# Altium footprint library 7-Connectors-8.PcbLib: 18 footprints (part 1 of 2) (continued)
## FCI_10058937-100ABTLF [mm] "26 Contacts, Pitch 1mm, Surface Mount ExpressCard Host Connector"
height 5.5
pads (28):
  rect 0.7x2 smd: 1(-12.5,0) 2(-11.5,0) 3(-10.5,0) 4(-9.5,0) 5(-8.5,0) 6(-7.5,0) 7(-6.5,0) 8(-5.5,0) 9(-4.5,0) 10(-3.5,0) 11(-2.5,0) 12(-1.5,0) 13(-0.5,0) 14(0.5,0) 15(1.5,0) 16(2.5,0) 17(3.5,0) 18(4.5,0) 19(5.5,0) 20(6.5,0) 21(7.5,0) 22(8.5,0) 23(9.5,0) 24(10.5,0) 25(11.5,0) 26(12.5,0)
  round 1 hole 2 unplated mask+0.5: Mec1(-17.1,-3.5)
  round 1 hole 1.6 unplated mask+0.3: Mec2(17.1,-3.5)
Top Layer:
  region: -19.2,-0.8 -13.2,-0.8 -13.2,-1.3 13.2,-1.3 13.2,-0.8 19.2,-0.8 19.2,-11.75 -19.2,-11.75
Top Overlay:
  drawing of 182 lines, arcs and shapes, not listed
Mechanical 8:
  drawing of 174 lines, arcs and shapes, not listed
Mechanical 14:
  drawing of 181 lines, arcs and shapes, not listed
Mechanical 15:
  lines w0.05: -19.35,-14.9 19.35,-14.9 19.35,1.25 -19.35,1.25 -19.35,-14.9
3D body "FCI_10058937-100ABTLF.stp": height 5.5, standoff -0.9, extent -19.55,-14.65 19.1,0.604

## FCI_HM2R01PA5108N9LF [mm] "110+13 Contacts, 22 positions x 5 Rows (a,b,c,d,e) in Two Part + Shield  Row (f) 13 Positions, Pitch 2 mm,  Press-Fit, Right Angle Hard Metric Female Connector, Millipacs, Type A"
height 12.25
pads (125):
  round 1.1 hole 0.6: a1(5,24) a2(5,22) a3(5,20) a4(5,18) a5(5,16) a6(5,14) a7(5,12) a8(5,10) a9(5,8) a10(5,6) a11(5,4) a15(5,-4) a16(5,-6) a17(5,-8) a18(5,-10) a19(5,-12) a20(5,-14) a21(5,-16) a22(5,-18) a23(5,-20) a24(5,-22) a25(5,-24) b1(3,24) b2(3,22) b3(3,20) b4(3,18) b5(3,16) b6(3,14) b7(3,12) b8(3,10) b9(3,8) b10(3,6) b11(3,4) b15(3,-4) b16(3,-6) b17(3,-8) b18(3,-10) b19(3,-12) b20(3,-14) b21(3,-16) b22(3,-18) b23(3,-20) b24(3,-22) b25(3,-24) c1(1,24) c2(1,22) c3(1,20) c4(1,18) c5(1,16) c6(1,14) c7(1,12) c8(1,10) c9(1,8) c10(1,6) c11(1,4) c15(1,-4) c16(1,-6) c17(1,-8) c18(1,-10) c19(1,-12) c20(1,-14) c21(1,-16) c22(1,-18) c23(1,-20) c24(1,-22) c25(1,-24) d1(-1,24) d2(-1,22) d3(-1,20) d4(-1,18) d5(-1,16) d6(-1,14) d7(-1,12) d8(-1,10) d9(-1,8) d10(-1,6) d11(-1,4) d15(-1,-4) d16(-1,-6) d17(-1,-8) d18(-1,-10) d19(-1,-12) d20(-1,-14) d21(-1,-16) d22(-1,-18) d23(-1,-20) d24(-1,-22) d25(-1,-24) e1(-3,24) e2(-3,22) e3(-3,20) e4(-3,18) e5(-3,16) e6(-3,14) e7(-3,12) e8(-3,10) e9(-3,8) e10(-3,6) e11(-3,4) e15(-3,-4) e16(-3,-6) e17(-3,-8) e18(-3,-10) e19(-3,-12) e20(-3,-14) e21(-3,-16) e22(-3,-18) e23(-3,-20) e24(-3,-22) e25(-3,-24) f1(-5,24) f3(-5,20) f5(-5,16) f7(-5,12) f9(-5,8) f11(-5,4) f13(-5,0) f15(-5,-4) f17(-5,-8) f19(-5,-12) f21(-5,-16) f23(-5,-20) f25(-5,-24)
  round 1 hole 2 unplated mask+0.6: MECH1(-3,0) MECH2(3,0)
Top Overlay:
  lines w0.2: -5.15,-25 15.8,-25 15.8,-1.825 ; -5.15,-23 -5.15,-21 ; -5.15,-19 -5.15,-17 ; -5.15,-15 -5.15,-13 ; -5.15,-11 -5.15,-9 ; -5.15,-7 -5.15,-5 ; -5.15,-3 -5.15,-1 ; -5.15,1 -5.15,3 ; -5.15,5 -5.15,7 ; -5.15,9 -5.15,11 ; -5.15,13 -5.15,15 ; -5.15,17 -5.15,19 ; -5.15,21 -5.15,23 ; -5.15,25 15.8,25 15.8,1.825 ; 8,-2.464 15.8,-2.464 ; 8,-1.824 17.4,-1.825 18.65,-0.575 18.65,0.575 17.4,1.825 8,1.825 ; 8,2.464 15.8,2.464 ; 15.1,-25 15.1,-3.05 ; 15.1,-23.45 9.65,-23.45 9.65,-22.55 15.1,-22.55 ; 15.1,-21.45 9.65,-21.45 9.65,-20.55 15.1,-20.55 ; 15.1,-19.45 9.65,-19.45 9.65,-18.55 15.1,-18.55 ; 15.1,-17.45 9.65,-17.45 9.65,-16.55 15.1,-16.55 ; 15.1,-15.45 9.65,-15.45 9.65,-14.55 15.1,-14.55 ; 15.1,-13.45 9.65,-13.45 9.65,-12.55 15.1,-12.55 ; 15.1,-11.45 9.65,-11.45 9.65,-10.55 15.1,-10.55 ; 15.1,-9.45 9.65,-9.45 9.65,-8.55 15.1,-8.55 ; 15.1,-7.45 9.65,-7.45 9.65,-6.55 15.1,-6.55 ; 15.1,-5.45 9.65,-5.45 9.65,-4.55 15.1,-4.55 ; 15.1,3.05 15.1,25 ; 15.1,4.55 9.65,4.55 9.65,5.45 15.1,5.45 ; 15.1,6.55 9.65,6.55 9.65,7.45 15.1,7.45 ; 15.1,8.55 9.65,8.55 9.65,9.45 15.1,9.45 ; 15.1,10.55 9.65,10.55 9.65,11.45 15.1,11.45 ; 15.1,12.55 9.65,12.55 9.65,13.45 15.1,13.45 ; 15.1,14.55 9.65,14.55 9.65,15.45 15.1,15.45 ; 15.1,16.55 9.65,16.55 9.65,17.45 15.1,17.45 ; 15.1,18.55 9.65,18.55 9.65,19.45 15.1,19.45 ; 15.1,20.55 9.65,20.55 9.65,21.45 15.1,21.45 ; 15.1,22.55 9.65,22.55 9.65,23.45 15.1,23.45 ; 15.8,-3.05 8,-3.05 8,3.05 15.8,3.05 ; 17.325,-1.825 17.325,1.825 ; 17.75,-1.5 19,-0.25 19,0.25 17.75,1.5
  text "a" at 4.667,25.492 h1.5
  text "e" at -3.333,25.542 h1.5
  text "d" at -1.333,25.5 h1.5
  text "c" at 0.692,25.492 h1.5
  text "b" at 2.667,25.5 h1.5
  text "f" at -5.363,25.5 h1.5
  text "1" at -5.975,23.8 h1.2
  text "11" at -5.975,3.217 h1.2
  text "20" at -5.975,-14.783 h1.2
  text "25" at -5.975,-24.783 h1.2
Mechanical 8:
  drawing of 506 lines, arcs and shapes, not listed
Mechanical 14:
  lines w0.1: 8,-2.464 15.8,-2.464 ; 8,-1.824 17.4,-1.825 18.65,-0.575 18.65,0.575 17.4,1.825 8,1.825 ; 8,2.464 15.8,2.464 ; 15.1,-25 15.1,-3.05 ; 15.1,-23.45 9.65,-23.45 9.65,-22.55 15.1,-22.55 ; 15.1,-21.45 9.65,-21.45 9.65,-20.55 15.1,-20.55 ; 15.1,-19.45 9.65,-19.45 9.65,-18.55 15.1,-18.55 ; 15.1,-17.45 9.65,-17.45 9.65,-16.55 15.1,-16.55 ; 15.1,-15.45 9.65,-15.45 9.65,-14.55 15.1,-14.55 ; 15.1,-13.45 9.65,-13.45 9.65,-12.55 15.1,-12.55 ; 15.1,-11.45 9.65,-11.45 9.65,-10.55 15.1,-10.55 ; 15.1,-9.45 9.65,-9.45 9.65,-8.55 15.1,-8.55 ; 15.1,-7.45 9.65,-7.45 9.65,-6.55 15.1,-6.55 ; 15.1,-5.45 9.65,-5.45 9.65,-4.55 15.1,-4.55 ; 15.1,3.05 15.1,25 ; 15.1,4.55 9.65,4.55 9.65,5.45 15.1,5.45 ; 15.1,6.55 9.65,6.55 9.65,7.45 15.1,7.45 ; 15.1,8.55 9.65,8.55 9.65,9.45 15.1,9.45 ; 15.1,10.55 9.65,10.55 9.65,11.45 15.1,11.45 ; 15.1,12.55 9.65,12.55 9.65,13.45 15.1,13.45 ; 15.1,14.55 9.65,14.55 9.65,15.45 15.1,15.45 ; 15.1,16.55 9.65,16.55 9.65,17.45 15.1,17.45 ; 15.1,18.55 9.65,18.55 9.65,19.45 15.1,19.45 ; 15.1,20.55 9.65,20.55 9.65,21.45 15.1,21.45 ; 15.1,22.55 9.65,22.55 9.65,23.45 15.1,23.45 ; 15.8,-3.05 8,-3.05 8,3.05 15.8,3.05 ; 15.8,-1.825 15.8,-25 -5.15,-25 -5.15,25 15.8,25 15.8,1.825 ; 17.325,-1.825 17.325,1.825 ; 17.75,-1.5 19,-0.25 19,0.25 17.75,1.5
  text "a" at 4.667,25.492 h1.5
  text "b" at 2.667,25.5 h1.5
  text "c" at 0.692,25.492 h1.5
  text "d" at -1.333,25.5 h1.5
  text "e" at -3.333,25.542 h1.5
  text "f" at -5.363,25.5 h1.5
  text "25" at -5.975,-24.783 h1.2
  text "20" at -5.975,-14.783 h1.2
  text "11" at -5.975,3.217 h1.2
  text "1" at -5.975,23.8 h1.2
Drill Drawing:
  lines w0.1: -6.25,-18.7 -6.25,-25 6.15,-25 6.15,-2.475 -5.15,-2.475 -5.15,2.475 6.15,2.475 6.15,25 -6.25,25 -6.25,19.6
  text "PRESS-FIT TECHNOLOGY diam. 0.6mm +0.05 -0" at -6.1,-17.85 h1
3D body "FCI_HM2R01PA5108N9LF.stp": height 8.13, standoff -4.13, extent -5.15,-25 19,25

## FCI_HM2R70PA5108N9LF [mm] "110+11 Contacts, 22 positions x 5 Rows  (a,b,c,d,e) +  Shield  Row (f) 11 Positions, Pitch 2 mm,  Press-Fit, Right Angle Hard Metric Female Connector, Millipacs, Type B22"
height 11.4
pads (121):
  round 1.1 hole 0.6: a1(4,21) a2(4,19) a3(4,17) a4(4,15) a5(4,13) a6(4,11) a7(4,9) a8(4,7) a9(4,5) a10(4,3) a11(4,1) a12(4,-1) a13(4,-3) a14(4,-5) a15(4,-7) a16(4,-9) a17(4,-11) a18(4,-13) a19(4,-15) a20(4,-17) a21(4,-19) a22(4,-21) b1(2,21) b2(2,19) b3(2,17) b4(2,15) b5(2,13) b6(2,11) b7(2,9) b8(2,7) b9(2,5) b10(2,3) b11(2,1) b12(2,-1) b13(2,-3) b14(2,-5) b15(2,-7) b16(2,-9) b17(2,-11) b18(2,-13) b19(2,-15) b20(2,-17) b21(2,-19) b22(2,-21) c1(0,21) c2(0,19) c3(0,17) c4(0,15) c5(0,13) c6(0,11) c7(0,9) c8(0,7) c9(0,5) c10(0,3) c11(0,1) c12(0,-1) c13(0,-3) c14(0,-5) c15(0,-7) c16(0,-9) c17(0,-11) c18(0,-13) c19(0,-15) c20(0,-17) c21(0,-19) c22(0,-21) d1(-2,21) d2(-2,19) d3(-2,17) d4(-2,15) d5(-2,13) d6(-2,11) d7(-2,9) d8(-2,7) d9(-2,5) d10(-2,3) d11(-2,1) d12(-2,-1) d13(-2,-3) d14(-2,-5) d15(-2,-7) d16(-2,-9) d17(-2,-11) d18(-2,-13) d19(-2,-15) d20(-2,-17) d21(-2,-19) d22(-2,-21) e1(-4,21) e2(-4,19) e3(-4,17) e4(-4,15) e5(-4,13) e6(-4,11) e7(-4,9) e8(-4,7) e9(-4,5) e10(-4,3) e11(-4,1) e12(-4,-1) e13(-4,-3) e14(-4,-5) e15(-4,-7) e16(-4,-9) e17(-4,-11) e18(-4,-13) e19(-4,-15) e20(-4,-17) e21(-4,-19) e22(-4,-21) f1(-6,21) f3(-6,17) f5(-6,13) f7(-6,9) f9(-6,5) f11(-6,1) f13(-6,-3) f15(-6,-7) f17(-6,-11) f19(-6,-15) f21(-6,-19)
Top Overlay:
  lines w0.2: -6.15,-20 -6.15,-22 14.8,-22 14.8,22 -6.15,22 ; -6.15,-18.002 -6.15,-16.002 ; -6.15,-14.002 -6.15,-12.002 ; -6.15,-10.002 -6.15,-8.002 ; -6.15,-6.002 -6.15,-4.002 ; -6.15,-2.002 -6.15,-0.002 ; -6.15,1.998 -6.15,3.998 ; -6.15,5.998 -6.15,7.998 ; -6.15,9.998 -6.15,11.998 ; -6.15,13.998 -6.15,15.998 ; -6.15,17.998 -6.15,19.998 ; 7,-22 7,22 ; 14.1,-22 14.1,22 ; 14.1,-20.45 8.65,-20.45 8.65,-19.55 14.1,-19.55 ; 14.1,-18.45 8.65,-18.45 8.65,-17.55 14.1,-17.55 ; 14.1,-16.45 8.65,-16.45 8.65,-15.55 14.1,-15.55 ; 14.1,-14.45 8.65,-14.45 8.65,-13.55 14.1,-13.55 ; 14.1,-12.45 8.65,-12.45 8.65,-11.55 14.1,-11.55 ; 14.1,-10.45 8.65,-10.45 8.65,-9.55 14.1,-9.55 ; 14.1,-8.45 8.65,-8.45 8.65,-7.55 14.1,-7.55 ; 14.1,-6.45 8.65,-6.45 8.65,-5.55 14.1,-5.55 ; 14.1,-4.45 8.65,-4.45 8.65,-3.55 14.1,-3.55 ; 14.1,-2.45 8.65,-2.45 8.65,-1.55 14.1,-1.55 ; 14.1,-0.45 8.65,-0.45 8.65,0.45 14.1,0.45 ; 14.1,1.55 8.65,1.55 8.65,2.45 14.1,2.45 ; 14.1,3.55 8.65,3.55 8.65,4.45 14.1,4.45 ; 14.1,5.55 8.65,5.55 8.65,6.45 14.1,6.45 ; 14.1,7.55 8.65,7.55 8.65,8.45 14.1,8.45 ; 14.1,9.55 8.65,9.55 8.65,10.45 14.1,10.45 ; 14.1,11.55 8.65,11.55 8.65,12.45 14.1,12.45 ; 14.1,13.55 8.65,13.55 8.65,14.45 14.1,14.45 ; 14.1,15.55 8.65,15.55 8.65,16.45 14.1,16.45 ; 14.1,17.55 8.65,17.55 8.65,18.45 14.1,18.45 ; 14.1,19.55 8.65,19.55 8.65,20.45 14.1,20.45
  text "11" at -6.975,0.217 h1.2
  text "1" at -6.975,20.8 h1.2
  text "f" at -6.363,22.5 h1.5
  text "b" at 1.667,22.5 h1.5
  text "c" at -0.333,22.667 h1.5
  text "d" at -2.333,22.5 h1.5
  text "e" at -4.333,22.667 h1.5
  text "a" at 3.592,22.517 h1.5
  text "22" at -6.975,-21.786 h1.2
  text "15" at -6.975,-7.783 h1.2
Mechanical 8:
  drawing of 490 lines, arcs and shapes, not listed
Mechanical 14:
  lines w0.1: -6.15,-22 14.8,-22 14.8,22 -6.15,22 ; 7,-22 7,22 ; 14.1,-22 14.1,22 ; 14.1,-20.45 8.65,-20.45 8.65,-19.55 14.1,-19.55 ; 14.1,-18.45 8.65,-18.45 8.65,-17.55 14.1,-17.55 ; 14.1,-16.45 8.65,-16.45 8.65,-15.55 14.1,-15.55 ; 14.1,-14.45 8.65,-14.45 8.65,-13.55 14.1,-13.55 ; 14.1,-12.45 8.65,-12.45 8.65,-11.55 14.1,-11.55 ; 14.1,-10.45 8.65,-10.45 8.65,-9.55 14.1,-9.55 ; 14.1,-8.45 8.65,-8.45 8.65,-7.55 14.1,-7.55 ; 14.1,-6.45 8.65,-6.45 8.65,-5.55 14.1,-5.55 ; 14.1,-4.45 8.65,-4.45 8.65,-3.55 14.1,-3.55 ; 14.1,-2.45 8.65,-2.45 8.65,-1.55 14.1,-1.55 ; 14.1,-0.45 8.65,-0.45 8.65,0.45 14.1,0.45 ; 14.1,1.55 8.65,1.55 8.65,2.45 14.1,2.45 ; 14.1,3.55 8.65,3.55 8.65,4.45 14.1,4.45 ; 14.1,5.55 8.65,5.55 8.65,6.45 14.1,6.45 ; 14.1,7.55 8.65,7.55 8.65,8.45 14.1,8.45 ; 14.1,9.55 8.65,9.55 8.65,10.45 14.1,10.45 ; 14.1,11.55 8.65,11.55 8.65,12.45 14.1,12.45 ; 14.1,13.55 8.65,13.55 8.65,14.45 14.1,14.45 ; 14.1,15.55 8.65,15.55 8.65,16.45 14.1,16.45 ; 14.1,17.55 8.65,17.55 8.65,18.45 14.1,18.45 ; 14.1,19.55 8.65,19.55 8.65,20.45 14.1,20.45
  text "1" at -6.975,20.8 h1.2
  text "11" at -6.975,0.217 h1.2
  text "f" at -6.363,22.5 h1.5
  text "e" at -4.333,22.667 h1.5
  text "d" at -2.333,22.5 h1.5
  text "c" at -0.333,22.667 h1.5
  text "b" at 1.667,22.5 h1.5
  text "a" at 3.592,22.517 h1.5
  text "22" at -6.975,-21.786 h1.2
  text "15" at -6.975,-7.783 h1.2
Drill Drawing:
  lines w0.1: -6.975,-19.3 -6.975,-22 5.225,-22 5.225,22 -6.975,22 -6.975,19.075
  text "PRESS-FIT TECHNOLOGY diam. 0.6mm +0.05 -0" at -7.25,-18.175 h1
3D body "FCI_HM2R70PA5108N9LF.stp": height 7.7, standoff -3.7, extent -6.15,-22 14.8,22

## HARTING_17 26 220 2102 [mm] "HAR-BUS HM, 220 Contacts (abcdef) Female Connector, Type Monoblock 47, with Shield  Row(f)"
height 12.35
pads (244):
  round 1.1 hole 0.6: a1(0,0) a2(0,-2) a3(0,-4) a4(0,-6) a5(0,-8) a6(0,-10) a7(0,-12) a8(0,-14) a9(0,-16) a10(0,-18) a11(0,-20) a12(0,-22) a13(0,-24) a14(0,-26) a15(0,-28) a16(0,-30) a17(0,-32) a18(0,-34) a19(0,-36) a20(0,-38) a21(0,-40) a22(0,-42) a23(0,-44) a24(0,-46) a25(0,-48) a26(0,-50) a27(0,-52) a28(0,-54) a29(0,-56) a30(0,-58) a31(0,-60) a32(0,-62) a33(0,-64) a37(0,-72) a38(0,-74) a39(0,-76) a40(0,-78) a41(0,-80) a42(0,-82) a43(0,-84) a44(0,-86) a45(0,-88) a46(0,-90) a47(0,-92) b1(-2,0) b2(-2,-2) b3(-2,-4) b4(-2,-6) b5(-2,-8) b6(-2,-10) b7(-2,-12) b8(-2,-14) b9(-2,-16) b10(-2,-18) b11(-2,-20) b12(-2,-22) b13(-2,-24) b14(-2,-26) b15(-2,-28) b16(-2,-30) b17(-2,-32) b18(-2,-34) b19(-2,-36) b20(-2,-38) b21(-2,-40) b22(-2,-42) b23(-2,-44) b24(-2,-46) b25(-2,-48) b26(-2,-50) b27(-2,-52) b28(-2,-54) b29(-2,-56) b30(-2,-58) b31(-2,-60) b32(-2,-62) b33(-2,-64) b37(-2,-72) b38(-2,-74) b39(-2,-76) b40(-2,-78) b41(-2,-80) b42(-2,-82) b43(-2,-84) b44(-2,-86) b45(-2,-88) b46(-2,-90) b47(-2,-92) c1(-4,0) c2(-4,-2) c3(-4,-4) c4(-4,-6) c5(-4,-8) c6(-4,-10) c7(-4,-12) c8(-4,-14) c9(-4,-16) c10(-4,-18) c11(-4,-20) c12(-4,-22) c13(-4,-24) c14(-4,-26) c15(-4,-28) c16(-4,-30) c17(-4,-32) c18(-4,-34) c19(-4,-36) c20(-4,-38) c21(-4,-40) c22(-4,-42) c23(-4,-44) c24(-4,-46) c25(-4,-48) c26(-4,-50) c27(-4,-52) c28(-4,-54) c29(-4,-56) c30(-4,-58) c31(-4,-60) c32(-4,-62) c33(-4,-64) c37(-4,-72) c38(-4,-74) c39(-4,-76) c40(-4,-78) c41(-4,-80) c42(-4,-82) c43(-4,-84) c44(-4,-86) c45(-4,-88) c46(-4,-90) c47(-4,-92) d1(-6,0) d2(-6,-2) d3(-6,-4) d4(-6,-6) d5(-6,-8) d6(-6,-10) d7(-6,-12) d8(-6,-14) d9(-6,-16) d10(-6,-18) d11(-6,-20) d12(-6,-22) d13(-6,-24) d14(-6,-26) d15(-6,-28) d16(-6,-30) d17(-6,-32) d18(-6,-34) d19(-6,-36) d20(-6,-38) d21(-6,-40) d22(-6,-42) d23(-6,-44) d24(-6,-46) d25(-6,-48) d26(-6,-50) d27(-6,-52) d28(-6,-54) d29(-6,-56) d30(-6,-58) d31(-6,-60) d32(-6,-62) d33(-6,-64) d37(-6,-72) d38(-6,-74) d39(-6,-76) d40(-6,-78) d41(-6,-80) d42(-6,-82) d43(-6,-84) d44(-6,-86) d45(-6,-88) d46(-6,-90) d47(-6,-92) e1(-8,0) e2(-8,-2) e3(-8,-4) e4(-8,-6) e5(-8,-8) e6(-8,-10) e7(-8,-12) e8(-8,-14) e9(-8,-16) e10(-8,-18) e11(-8,-20) e12(-8,-22) e13(-8,-24) e14(-8,-26) e15(-8,-28) e16(-8,-30) e17(-8,-32) e18(-8,-34) e19(-8,-36) e20(-8,-38) e21(-8,-40) e22(-8,-42) e23(-8,-44) e24(-8,-46) e25(-8,-48) e26(-8,-50) e27(-8,-52) e28(-8,-54) e29(-8,-56) e30(-8,-58) e31(-8,-60) e32(-8,-62) e33(-8,-64) e37(-8,-72) e38(-8,-74) e39(-8,-76) e40(-8,-78) e41(-8,-80) e42(-8,-82) e43(-8,-84) e44(-8,-86) e45(-8,-88) e46(-8,-90) e47(-8,-92) f1(-10,0) f3(-10,-4) f5(-10,-8) f7(-10,-12) f9(-10,-16) f11(-10,-20) f13(-10,-24) f15(-10,-28) f17(-10,-32) f19(-10,-36) f21(-10,-40) f23(-10,-44) f25(-10,-48) f27(-10,-52) f29(-10,-56) f31(-10,-60) f33(-10,-64) f35(-10,-68) f37(-10,-72) f39(-10,-76) f41(-10,-80) f43(-10,-84) f45(-10,-88) f47(-10,-92)
Top Overlay:
  drawing of 311 lines, arcs and shapes, not listed
  text "20" at -10.7,-38.833 h1.2
  text "10" at -10.7,-18.833 h1.2
  text "47" at -10.7,-92.833 h1.2
  text "37" at -10.7,-72.833 h1.2
  text "33" at -10.7,-64.833 h1.2
  text "f" at -10.363,1.5 h1.5
  text "a" at -0.333,1.667 h1.5
  text "b" at -2.333,1.5 h1.5
  text "c" at -4.333,1.667 h1.5
  text "d" at -6.333,1.5 h1.5
  text "e" at -8.333,1.667 h1.5
  text "1" at -10.7,-0.25 h1.2
Mechanical 8:
  drawing of 491 lines, arcs and shapes, not listed
  text "PCB" at 1.3,-48 h1.5
Mechanical 14:
  drawing of 287 lines, arcs and shapes, not listed
  text "20" at -10.7,-38.833 h1.2
  text "10" at -10.7,-18.833 h1.2
  text "47" at -10.7,-92.833 h1.2
  text "37" at -10.7,-72.833 h1.2
  text "33" at -10.7,-64.833 h1.2
  text "1" at -10.7,-0.25 h1.2
  text "f" at -10.363,1.5 h1.5
  text "e" at -8.333,1.667 h1.5
  text "d" at -6.333,1.5 h1.5
  text "c" at -4.333,1.667 h1.5
  text "b" at -2.333,1.5 h1.5
  text "a" at -0.333,1.667 h1.5
Drill Drawing:
  lines w0.1: -11,-92.95 -11,1 ; 1,-92.95 1,1
  lines w0.2: -11,-92.95 1,-92.95 ; -11,1 1,1
  text "PRESS-FIT TECHNOLOGY diam. 0.6mm +0.05 -0" at 2.625,-67.398 h1
3D body "HARTING_17 26 220 2102.stp": height 8.15, standoff -4.1, extent -10.1,-92.95 13.65,0.95

## MTGP720H320V6P [mm]
pads (1):
  round 7.2 hole 3.25: 1(0,0)
via -2.2,-1.35 diameter 1 hole 0.5
via -2.2,1.375 diameter 1 hole 0.5
via 0,2.525 diameter 1 hole 0.5
via 2.2,1.35 diameter 1 hole 0.5
via 0,-2.625 diameter 1 hole 0.5
via 2.2,-1.35 diameter 1 hole 0.5
Mechanical 8:
  circle w0.1: c0,0 r2.6
  circle w0.1: c0,0 r3.75
  lines w0.1: -2.657,1.625 -2.224,1.375 ; -2.632,-1.6 -2.199,-1.35 ; -2.474,0.942 -2.224,1.375 ; -2.449,-0.917 -2.199,-1.35 ; -1.974,1.808 -2.224,1.375 ; -1.949,-1.783 -2.199,-1.35 ; -1.791,1.125 -2.224,1.375 ; -1.766,-1.1 -2.199,-1.35 ; -0.5,-2.625 0,-2.625 ; -0.5,0 0,0 ; -0.5,2.525 0,2.525 ; 0,-3.125 0,-2.625 ; 0,-2.125 0,-2.625 ; 0,-0.5 0,0 ; 0,0.5 0,0 ; 0,2.025 0,2.525 ; 0,3.025 0,2.525 ; 0.5,-2.625 0,-2.625 ; 0.5,0 0,0 ; 0.5,2.525 0,2.525 ; 1.766,-1.1 2.199,-1.35 ; 1.766,1.1 2.199,1.35 ; 1.949,-1.783 2.199,-1.35 ; 1.949,1.783 2.199,1.35 ; 2.449,-0.917 2.199,-1.35 ; 2.449,0.917 2.199,1.35 ; 2.632,-1.6 2.199,-1.35 ; 2.632,1.6 2.199,1.35
Mechanical 14:
  circle w0.1: c0,0 r3.75
Mechanical 15:
  circle w0.05: c0,0 r3.85
3D body "mtgp720h320v6p.stp": height 0.1, standoff -1.75, extent -3.627,-3.627 3.628,3.628

## PB [mm]
Top Overlay:
  circle w0.5: c-0.031,0.013 r2.5
  lines w0.5: -1.737,1.719 1.675,-1.693
  text "Pb" at -1.536,-0.948 h3.05
3D body "pb.stp": height 0.02, standoff 0, extent -2.725,-2.725 2.725,2.725

## TP [mm]
height 11.7
pads (1):
  round 2 smd mask+1: W(0,0)
Top Overlay:
  circle w0.254: c0,0 r2.195
Keep-Out Layer:
  circle w0.025: c0,0 r2.017
3D body "1_016-1_016-3_tp.stp": height 0.02, standoff 0, extent -1.5,-1.5 1.5,1.5

## TYCO_6-103634-3 [mm] "14 Circuits, Pitch 2.54mm, Right Angle Single-Row Polarized/Latching AMPMODU MTE Header"
height 7.41
pads (14):
  round 1.6 hole 0.9: 1(-16.51,0) 2(-13.97,0) 3(-11.43,0) 4(-8.89,0) 5(-6.35,0) 6(-3.81,0) 7(-1.27,0) 8(1.27,0) 9(3.81,0) 10(6.35,0) 11(8.89,0) 12(11.43,0) 13(13.97,0) 14(16.51,0)
Top Overlay:
  circle w0.3: c-16.533,-1.778 r0.15
  lines w0.2: -17.306,-0.898 -17.424,-1.016 -18.136,-1.016 -18.72,-0.432 -18.72,0.318 -19.05,0.318 -19.05,12.573 19.05,12.573 19.05,0.318 18.72,0.318 18.72,-0.432 18.136,-1.016 17.424,-1.016 17.306,-0.898 ; -17.085,12.575 -16.501,11.991 -15.917,12.575 ; -15.596,-1.016 -14.884,-1.016 ; -13.056,-1.016 -12.344,-1.016 ; -10.516,-1.016 -9.804,-1.016 ; -7.976,-1.016 -7.264,-1.016 ; -5.436,-1.016 -4.724,-1.016 ; -3.81,11.049 3.81,11.049 ; -3.81,12.573 -3.81,8.763 -1.524,8.763 ; -2.896,-1.016 -2.184,-1.016 ; -2.794,8.763 -2.794,11.049 ; -1.587,8.763 -1.587,9.525 -0.952,9.525 ; -0.356,-1.016 0.356,-1.016 ; 0.953,9.525 1.588,9.525 1.588,8.763 ; 1.524,8.763 3.81,8.763 3.81,12.573 ; 2.184,-1.016 2.896,-1.016 ; 2.794,8.763 2.794,11.049 ; 4.724,-1.016 5.436,-1.016 ; 7.264,-1.016 7.976,-1.016 ; 9.804,-1.016 10.516,-1.016 ; 12.344,-1.016 13.056,-1.016 ; 14.884,-1.016 15.596,-1.016 15.714,-0.898
Mechanical 8:
  lines w0.1: -17.01,0 -16.51,0 ; -16.51,-0.5 -16.51,0 ; -16.51,0.5 -16.51,0 ; -16.01,0 -16.51,0 ; -14.47,0 -13.97,0 ; -13.97,-0.5 -13.97,0 ; -13.97,0.5 -13.97,0 ; -13.47,0 -13.97,0 ; -11.93,0 -11.43,0 ; -11.43,-0.5 -11.43,0 ; -11.43,0.5 -11.43,0 ; -10.93,0 -11.43,0 ; -9.39,0 -8.89,0 ; -8.89,-0.5 -8.89,0 ; -8.89,0.5 -8.89,0 ; -8.39,0 -8.89,0 ; -6.85,0 -6.35,0 ; -6.35,-0.5 -6.35,0 ; -6.35,0.5 -6.35,0 ; -5.85,0 -6.35,0 ; -4.31,0 -3.81,0 ; -3.81,-0.5 -3.81,0 ; -3.81,0.5 -3.81,0 ; -3.31,0 -3.81,0 ; -1.77,0 -1.27,0 ; -1.27,-0.5 -1.27,0 ; -1.27,0.5 -1.27,0 ; -0.77,0 -1.27,0 ; -0.354,-0.354 0,0 ; -0.354,0.354 0,0 ; 0.354,-0.354 0,0 ; 0.354,0.354 0,0 ; 0.77,0 1.27,0 ; 1.27,-0.5 1.27,0 ; 1.27,0.5 1.27,0 ; 1.77,0 1.27,0 ; 3.31,0 3.81,0 ; 3.81,-0.5 3.81,0 ; 3.81,0.5 3.81,0 ; 4.31,0 3.81,0 ; 5.85,0 6.35,0 ; 6.35,-0.5 6.35,0 ; 6.35,0.5 6.35,0 ; 6.85,0 6.35,0 ; 8.39,0 8.89,0 ; 8.89,-0.5 8.89,0 ; 8.89,0.5 8.89,0 ; 9.39,0 8.89,0 ; 10.93,0 11.43,0 ; 11.43,-0.5 11.43,0 ; 11.43,0.5 11.43,0 ; 11.93,0 11.43,0 ; 13.47,0 13.97,0 ; 13.97,-0.5 13.97,0 ; 13.97,0.5 13.97,0 ; 14.47,0 13.97,0 ; 16.01,0 16.51,0 ; 16.51,-0.5 16.51,0 ; 16.51,0.5 16.51,0 ; 17.01,0 16.51,0
Mechanical 14:
  lines w0.1: -17.085,12.575 -16.501,11.991 -15.917,12.575 ; -16.84,-0.318 -16.18,-0.318 ; -14.3,-0.318 -13.64,-0.318 ; -11.76,-0.318 -11.1,-0.318 ; -9.22,-0.318 -8.56,-0.318 ; -6.68,-0.318 -6.02,-0.318 ; -4.14,-0.318 -3.48,-0.318 ; -3.81,11.049 3.81,11.049 ; -3.81,12.573 -3.81,8.763 -1.524,8.763 -1.524,3.683 1.524,3.683 1.524,8.763 3.81,8.763 3.81,12.573 ; -2.794,8.763 -2.794,11.049 ; -1.6,-0.318 -0.94,-0.318 ; -1.587,8.763 -1.587,9.525 -0.952,9.525 -0.952,3.683 ; 0.94,-0.318 1.6,-0.318 ; 0.953,3.683 0.953,9.525 1.588,9.525 1.588,8.763 ; 2.794,8.763 2.794,11.049 ; 3.48,-0.318 4.14,-0.318 ; 6.02,-0.318 6.68,-0.318 ; 8.56,-0.318 9.22,-0.318 ; 11.1,-0.318 11.76,-0.318 ; 13.64,-0.318 14.3,-0.318 ; 16.18,-0.318 16.84,-0.318 ; -19.05,0.318 -19.05,12.573 19.05,12.573 19.05,0.318 18.72,0.318 18.72,-0.432 18.136,-1.016 17.424,-1.016 16.84,-0.432 16.84,0.318 16.18,0.318 16.18,-0.432 15.596,-1.016 14.884,-1.016 14.3,-0.432 14.3,0.318 13.64,0.318 13.64,-0.432 13.056,-1.016 12.344,-1.016 11.76,-0.432 11.76,0.318 11.1,0.318 11.1,-0.432 10.516,-1.016 9.804,-1.016 9.22,-0.432 9.22,0.318 8.56,0.318 8.56,-0.432 7.976,-1.016 7.264,-1.016 6.68,-0.432 6.68,0.318 6.02,0.318 6.02,-0.432 5.436,-1.016 4.724,-1.016 4.14,-0.432 4.14,0.318 3.48,0.318 3.48,-0.432 2.896,-1.016 2.184,-1.016 1.6,-0.432 1.6,0.318 0.94,0.318 0.94,-0.432 0.356,-1.016 -0.356,-1.016 -0.94,-0.432 -0.94,0.318 -1.6,0.318 -1.6,-0.432 -2.184,-1.016 -2.896,-1.016 -3.48,-0.432 -3.48,0.318 -4.14,0.318 -4.14,-0.432 -4.724,-1.016 -5.436,-1.016 -6.02,-0.432 -6.02,0.318 -6.68,0.318 -6.68,-0.432 -7.264,-1.016 -7.976,-1.016 -8.56,-0.432 -8.56,0.318 -9.22,0.318 -9.22,-0.432 -9.804,-1.016 -10.516,-1.016 -11.1,-0.432 -11.1,0.318 -11.76,0.318 -11.76,-0.432 -12.344,-1.016 -13.056,-1.016 -13.64,-0.432 -13.64,0.318 -14.3,0.318 -14.3,-0.432 -14.884,-1.016 -15.596,-1.016 -16.18,-0.432 -16.18,0.318 -16.84,0.318 -16.84,-0.432 -17.424,-1.016 -18.136,-1.016 -18.72,-0.432 -18.72,0.318 -19.05,0.318
3D body "TYCO_6-103634-3.stp": height 6.98, standoff -3.3, extent -19.05,-1.016 19.05,12.573

## TYCO_5650870-4 [mm] "DIN 41612 Class 2, Type R, Thru-Hole; Rows a+c, 64 Positions, Performance level 2, Lead 2.79mm, Right Angle Female Connector"
height 9.11
pads (66):
  round 1.7 hole 1: a1(0,0) a2(0,-2.54) a3(0,-5.08) a4(0,-7.62) a5(0,-10.16) a6(0,-12.7) a7(0,-15.24) a8(0,-17.78) a9(0,-20.32) a10(0,-22.86) a11(0,-25.4) a12(0,-27.94) a13(0,-30.48) a14(0,-33.02) a15(0,-35.56) a16(0,-38.1) a17(0,-40.64) a18(0,-43.18) a19(0,-45.72) a20(0,-48.26) a21(0,-50.8) a22(0,-53.34) a23(0,-55.88) a24(0,-58.42) a25(0,-60.96) a26(0,-63.5) a27(0,-66.04) a28(0,-68.58) a29(0,-71.12) a30(0,-73.66) a31(0,-76.2) a32(0,-78.74) c1(-5.08,0) c2(-5.08,-2.54) c3(-5.08,-5.08) c4(-5.08,-7.62) c5(-5.08,-10.16) c6(-5.08,-12.7) c7(-5.08,-15.24) c8(-5.08,-17.78) c9(-5.08,-20.32) c10(-5.08,-22.86) c11(-5.08,-25.4) c12(-5.08,-27.94) c13(-5.08,-30.48) c14(-5.08,-33.02) c15(-5.08,-35.56) c16(-5.08,-38.1) c17(-5.08,-40.64) c18(-5.08,-43.18) c19(-5.08,-45.72) c20(-5.08,-48.26) c21(-5.08,-50.8) c22(-5.08,-53.34) c23(-5.08,-55.88) c24(-5.08,-58.42) c25(-5.08,-60.96) c26(-5.08,-63.5) c27(-5.08,-66.04) c28(-5.08,-68.58) c29(-5.08,-71.12) c30(-5.08,-73.66) c31(-5.08,-76.2) c32(-5.08,-78.74)
  round 3.5 / inner round 3.5 / far side round 5.1 hole 2.8: MTG1(2.54,5.08) MTG2(2.54,-83.82)
Top Overlay:
  lines w0.2: -5.01,-79.988 -5.01,-80.685 -3.76,-80.685 -3.76,-81 -0.06,-81 -0.06,-86.36 6.14,-86.36 6.14,7.62 -0.06,7.62 -0.06,2.26 -3.76,2.26 -3.76,1.945 -5.01,1.945 -5.01,1.248 ; -3.839,-78.89 -1.241,-78.89 ; -3.839,0.15 -1.241,0.15 ; 1.241,-78.89 1.64,-78.89 ; 1.241,0.15 1.64,0.15 ; 4.64,-86.36 4.64,-85.163 5.415,-83.82 3.978,-81.33 1.64,-81.33 1.64,2.59 3.978,2.59 5.415,5.08 4.64,6.423 4.64,7.62 ; 4.64,-82.477 4.64,3.737 ; 6.14,-81.82 12.03,-81.82 ; 6.14,-80.78 12.03,-80.78 12.64,-80.17 ; 6.14,2.04 12.03,2.04 12.64,1.43 ; 6.14,3.08 12.03,3.08 ; 12.03,-81.82 12.03,3.08 ; 12.03,-81.82 12.64,-81.21 12.64,2.47 12.03,3.08
  text "1" at -7.045,-0.55 h1.2
  text "c" at -4.055,2.865 h1.2
  text "a" at -0.8,2.915 h1.2
  text "32" at -8.57,-79.39 h1.2
  text "5" at -7.445,-10.86 h1.2
  text "10" at -8.495,-23.51 h1.2
  text "15" at -8.47,-36.11 h1.2
  text "20" at -8.57,-48.91 h1.2
  text "25" at -8.57,-61.61 h1.2
  text "30" at -8.57,-74.31 h1.2
Mechanical 8:
  drawing of 267 lines, arcs and shapes, not listed
  text "PCB" at 5.08,-41.275 h1.2
Mechanical 14:
  lines w0.1: -5.01,-78.89 -5.01,-80.685 -3.76,-80.685 -3.76,-81 -0.06,-81 -0.06,-86.36 6.14,-86.36 6.14,7.62 -0.06,7.62 -0.06,2.26 -3.76,2.26 -3.76,1.945 -5.01,1.945 -5.01,0.15 ; 1.64,-78.89 -5.72,-78.89 -5.72,0.15 1.64,0.15 ; 4.64,-86.36 4.64,-85.163 5.415,-83.82 3.978,-81.33 1.64,-81.33 1.64,2.59 3.978,2.59 5.415,5.08 4.64,6.423 4.64,7.62 ; 4.64,-82.477 4.64,3.737 ; 6.14,-81.82 12.03,-81.82 ; 6.14,-80.78 12.03,-80.78 12.64,-80.17 ; 6.14,2.04 12.03,2.04 12.64,1.43 ; 6.14,3.08 12.03,3.08 ; 12.03,-81.82 12.03,3.08 ; 12.03,-81.82 12.64,-81.21 12.64,2.47 12.03,3.08 ; 1.005,-84.16 1.005,-83.48 1.316,-83.48 cw(c2.54,-83.82) 3.764,-83.48 4.075,-83.48 4.075,-84.16 3.764,-84.16 cw(c2.54,-83.82) 1.316,-84.16 1.005,-84.16 ; 1.005,4.74 1.316,4.74 ccw(c2.54,5.08) 3.764,4.74 4.075,4.74 4.075,5.42 3.764,5.42 ccw(c2.54,5.08) 1.316,5.42 1.005,5.42 1.005,4.74
  text "1" at -7.045,-0.55 h1.2
  text "c" at -4.055,2.865 h1.2
  text "a" at -0.8,2.915 h1.2
  text "32" at -8.57,-79.39 h1.2
  text "5" at -7.445,-10.86 h1.2
  text "10" at -8.495,-23.51 h1.2
  text "15" at -8.47,-36.11 h1.2
  text "20" at -8.57,-48.91 h1.2
  text "25" at -8.57,-61.61 h1.2
  text "30" at -8.57,-74.31 h1.2
3D body "TYCO_5650870-4.stp": height 9.11, standoff -2.79, extent -5.72,-86.36 12.64,7.62